# Altium footprint library common.PcbLib: 552 footprints (part 18 of 35)
Each footprint in its own frame and in the unit in brackets; x right, y up, seen from the top. Pads: shape width x height; smd on the part's side, far side on the other; paste and mask are expansions set on the pad; w line width, h text height; cw(c..) or ccw(c..) is an arc to the next point about the centre after c.
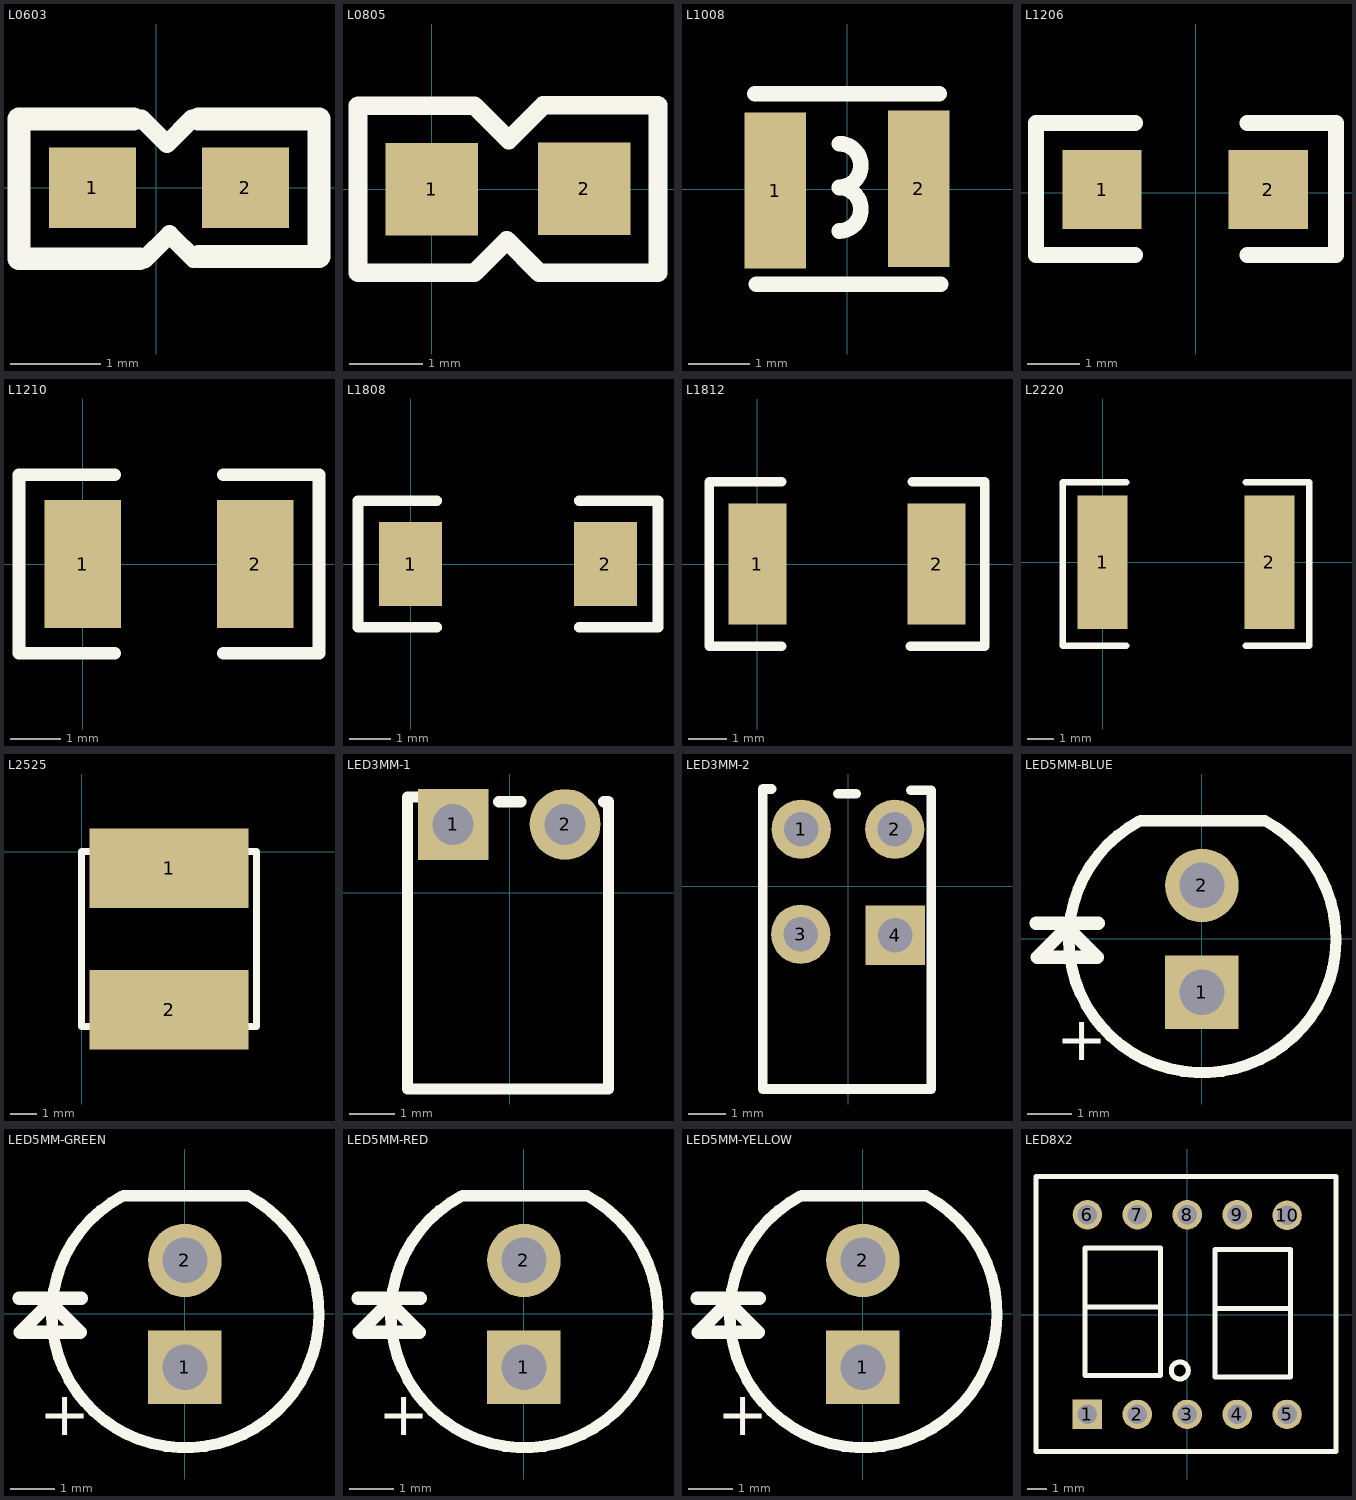
[diagram p17: the footprints below, top view; thin cyan lines are the x and y axes]

## L0603 [mil]
pads (2):
  rect 38x35 smd: 1(-28,0) 2(38.87,0)
Top Overlay:
  lines w8: -6.53,30.27 4.6,19.14 15.58,30.12 ; -5.3,-31.36 5.7,-20.36 16.32,-30.98
  lines w10: -9.9,30 -60,30 -60,-31 -7.3,-31 ; 18.4,30 71,30 71,-30 18.6,-30
3D body: height 20, standoff 0, extent -16,-15 28,15
3D body: height 20, standoff 0, extent 28,-15 36,15
3D body: height 20, standoff 0, extent -24,-15 -16,15

## L0805 [mm] "1/8W"
pads (2):
  rect 1.27x1.27 smd: 1(0,0) 2(2.09,0.005)
Top Overlay:
  lines w0.254: -1.011,-1.143 0.584,-1.143 1.029,-0.699 1.473,-1.143 3.099,-1.143 3.099,1.148 1.529,1.148 1.054,0.673 0.584,1.143 -1.011,1.143 -1.011,-1.143
3D body: height 0.55, standoff 0, extent 0.036,-0.62 2.036,0.64

## L1008 [mil] "2520"
height 209.84
pads (2):
  rect 39.37x100 smd: 1(-46,-1) 2(46,0.13)
Top Overlay:
  lines w10: -59.06,61 59.06,61 ; -58.11,-61 60,-61 ; -5,-26.86 ccw(c-5,-12.93) -5,1 ; -5,1.14 ccw(c-5,15.07) -5,29
3D body: height 91.14, standoff 0.09, extent -57.48,-54.92 57.48,54.93

## L1206 [mil] "1/4W"
pads (2):
  rect 60x60 smd: 1(-70.98,2.53) 2(55,2.53)
Top Overlay:
  lines w12: -46,-47 -121,-47 -121,53 -46,53 ; 39,-47 106.3,-47 106.3,53 39,53
3D body: height 62.99, standoff 0, extent -70.98,-27 55,32.06

## L1210 [mil]
pads (2):
  rect 60x100 smd: 1(0,0) 2(135,0)
Top Overlay:
  lines w10: 25,-70 -50,-70 -50,70 25,70 ; 110,-70 185,-70 185,70 110,70
3D body: height 78.74, standoff 0, extent 7.09,-51.96 131.11,46.48

## L1808 [mil]
pads (2):
  rect 60x80 smd: 1(0,0) 2(185,0)
Top Overlay:
  lines w10: 25,-60 -50,-60 -50,60 25,60 ; 160,-60 235,-60 235,60 160,60
3D body: height 39.37, standoff 0, extent 2,-39 179.77,37.49

## L1812 [mil]
pads (2):
  rect 60x125 smd: 1(0,0) 2(185,0)
Top Overlay:
  lines w10: 25,-85 -50,-85 -50,85 25,85 ; 158,-85 160,-85 235,-85 235,85 160,85 ; 159,-85 161,-85
3D body: height 118.11, standoff -2.01, extent 1.89,-63 184.11,62.98

## L2220 [mm]
pads (2):
  rect 1.905x5.08 smd: 1(0,0) 2(6.35,0)
Top Overlay:
  lines w0.254: 0.889,-3.175 -1.524,-3.175 -1.524,3.048 0.889,3.048 ; 5.461,-3.175 7.874,-3.175 7.874,3.048 5.461,3.048
3D body: height 2.5, standoff 0, extent 0.3,-2.489 6,2.511

## L2525 [mm]
pads (2):
  rect 6x3 smd: 1(3.302,-0.635) 2(3.302,-5.969)
Top Overlay:
  lines w0.254: 0,-6.604 0,0 6.604,0 6.604,-6.604 0,-6.604
3D body: height 4.5, standoff -0.01, extent 0.702,-6.133 5.902,-0.42

## LED3MM-1 [mil]
pads (2):
  rect 62x62 hole 36 mask+5: 1(-49.5,60)
  round 62 hole 36 mask+5: 2(48.5,60)
Top Overlay:
  lines w10: -80.5,84 -89.5,84 -89.5,-171.76 86.5,-171.76 86.5,80 82.5,80 ; -9.5,80 9.5,80
3D body: height 290.42, standoff -135.56, extent -87.58,-433 89.58,73.69

## LED3MM-2 [mil]
pads (4):
  round 62 hole 36 mask+5: 1(-49.5,60) 2(48.5,60) 3(-50,-50)
  rect 62x62 hole 36 mask+5: 4(49,-51)
Top Overlay:
  lines w10: -80.5,102.01 -89.5,102.01 -89.5,-212 86.5,-212 86.5,100.5 65,100.5 ; -11,97 8,97
3D body: height 386.81, standoff -118.31, extent -87,-322.01 83.08,102.01

## LED5MM-BLUE [mm]
pads (2):
  rect 1.65x1.651 hole 1.016 mask+0.03: 1(0,-1.2)
  oval 1.65x1.651 hole 1.016 mask+0.03: 2(0,1.2)
Top Overlay:
  lines w0.254: -1.4,2.644 ccw(c0.009,-0.005) 1.411,2.647 -1.378,2.647
  lines w0.3: -3.725,0.351 -2.328,0.351 ; -3.7,-0.411 -3.027,0.262 -2.354,-0.411 -2.608,-0.411 -3.7,-0.411
  text "+" at -3.268,-2.723 h1
3D body: height 8.6, standoff -2, extent -2.85,-2.824 2.85,2.526

## LED5MM-GREEN [mm]
pads (2):
  rect 1.65x1.651 hole 1.016 mask+0.03: 1(0,-1.2)
  oval 1.65x1.651 hole 1.016 mask+0.03: 2(0,1.2)
Top Overlay:
  lines w0.254: -1.4,2.644 ccw(c0.009,-0.005) 1.411,2.647 -1.378,2.647
  lines w0.3: -3.725,0.351 -2.328,0.351 ; -3.7,-0.411 -3.027,0.262 -2.354,-0.411 -2.608,-0.411 -3.7,-0.411
  text "+" at -3.268,-2.723 h1
3D body: height 8.8, standoff -1.8, extent -2.87,-2.802 2.829,2.548

## LED5MM-RED [mm]
pads (2):
  rect 1.65x1.651 hole 1.016 mask+0.03: 1(0,-1.2)
  oval 1.65x1.651 hole 1.016 mask+0.03: 2(0,1.2)
Top Overlay:
  lines w0.254: -1.4,2.644 ccw(c0.009,-0.005) 1.411,2.647 -1.378,2.647
  lines w0.3: -3.725,0.351 -2.328,0.351 ; -3.7,-0.411 -2.608,-0.411 -2.354,-0.411 -3.027,0.262 -3.7,-0.411
  text "+" at -3.268,-2.723 h1
3D body: height 8.6, standoff -2, extent -2.846,-2.891 2.853,2.459

## LED5MM-YELLOW [mm]
pads (2):
  rect 1.65x1.651 hole 1.016 mask+0.03: 1(0,-1.2)
  oval 1.65x1.651 hole 1.016 mask+0.03: 2(0,1.2)
Top Overlay:
  lines w0.254: -1.4,2.644 ccw(c0.009,-0.005) 1.411,2.647 -1.378,2.647
  lines w0.3: -3.725,0.351 -2.328,0.351 ; -3.7,-0.411 -2.608,-0.411 -2.354,-0.411 -3.027,0.262 -3.7,-0.411
  text "+" at -3.268,-2.723 h1
3D body: height 8.6, standoff -2, extent -2.85,-2.824 2.85,2.526

## LED8X2 [mm] "DIP; 16 Leads; Row Spacing 7.62 mm; Pitch 2.54 mm"
pads (10):
  rect 1.5x1.5 hole 1: 1(-5.08,-5.08)
  round 1.5 hole 1: 2(-2.54,-5.08) 3(0,-5.08) 4(2.54,-5.08) 5(5.08,-5.08) 6(-5.08,5.08) 7(-2.54,5.08) 8(0,5.08) 9(2.54,5.08) 10(5.08,5.049)
Top Overlay:
  circle w0.254: c-0.381,-2.845 r0.434
  lines w0.254: -5.156,0.381 -1.372,0.381 ; 1.473,0.305 5.258,0.305 ; -7.696,-6.96 7.569,-6.96 7.569,7.015 -7.696,7.015 -7.696,-6.96 ; -5.207,-3.099 -5.207,3.378 -1.372,3.378 -1.372,-3.099 -5.207,-3.099 ; 1.422,-3.175 5.258,-3.175 5.258,3.302 1.422,3.302 1.422,-3.175
3D body: height 7.2, standoff -1.9, extent -7.551,-6.985 7.449,7.015